# Altium footprint library PcbLib1.PcbLib: 50 footprints (part 1 of 4)
Each footprint in its own frame and in the unit in brackets; x right, y up, seen from the top. Pads: shape width x height; smd on the part's side, far side on the other; paste and mask are expansions set on the pad; w line width, h text height; cw(c..) or ccw(c..) is an arc to the next point about the centre after c.
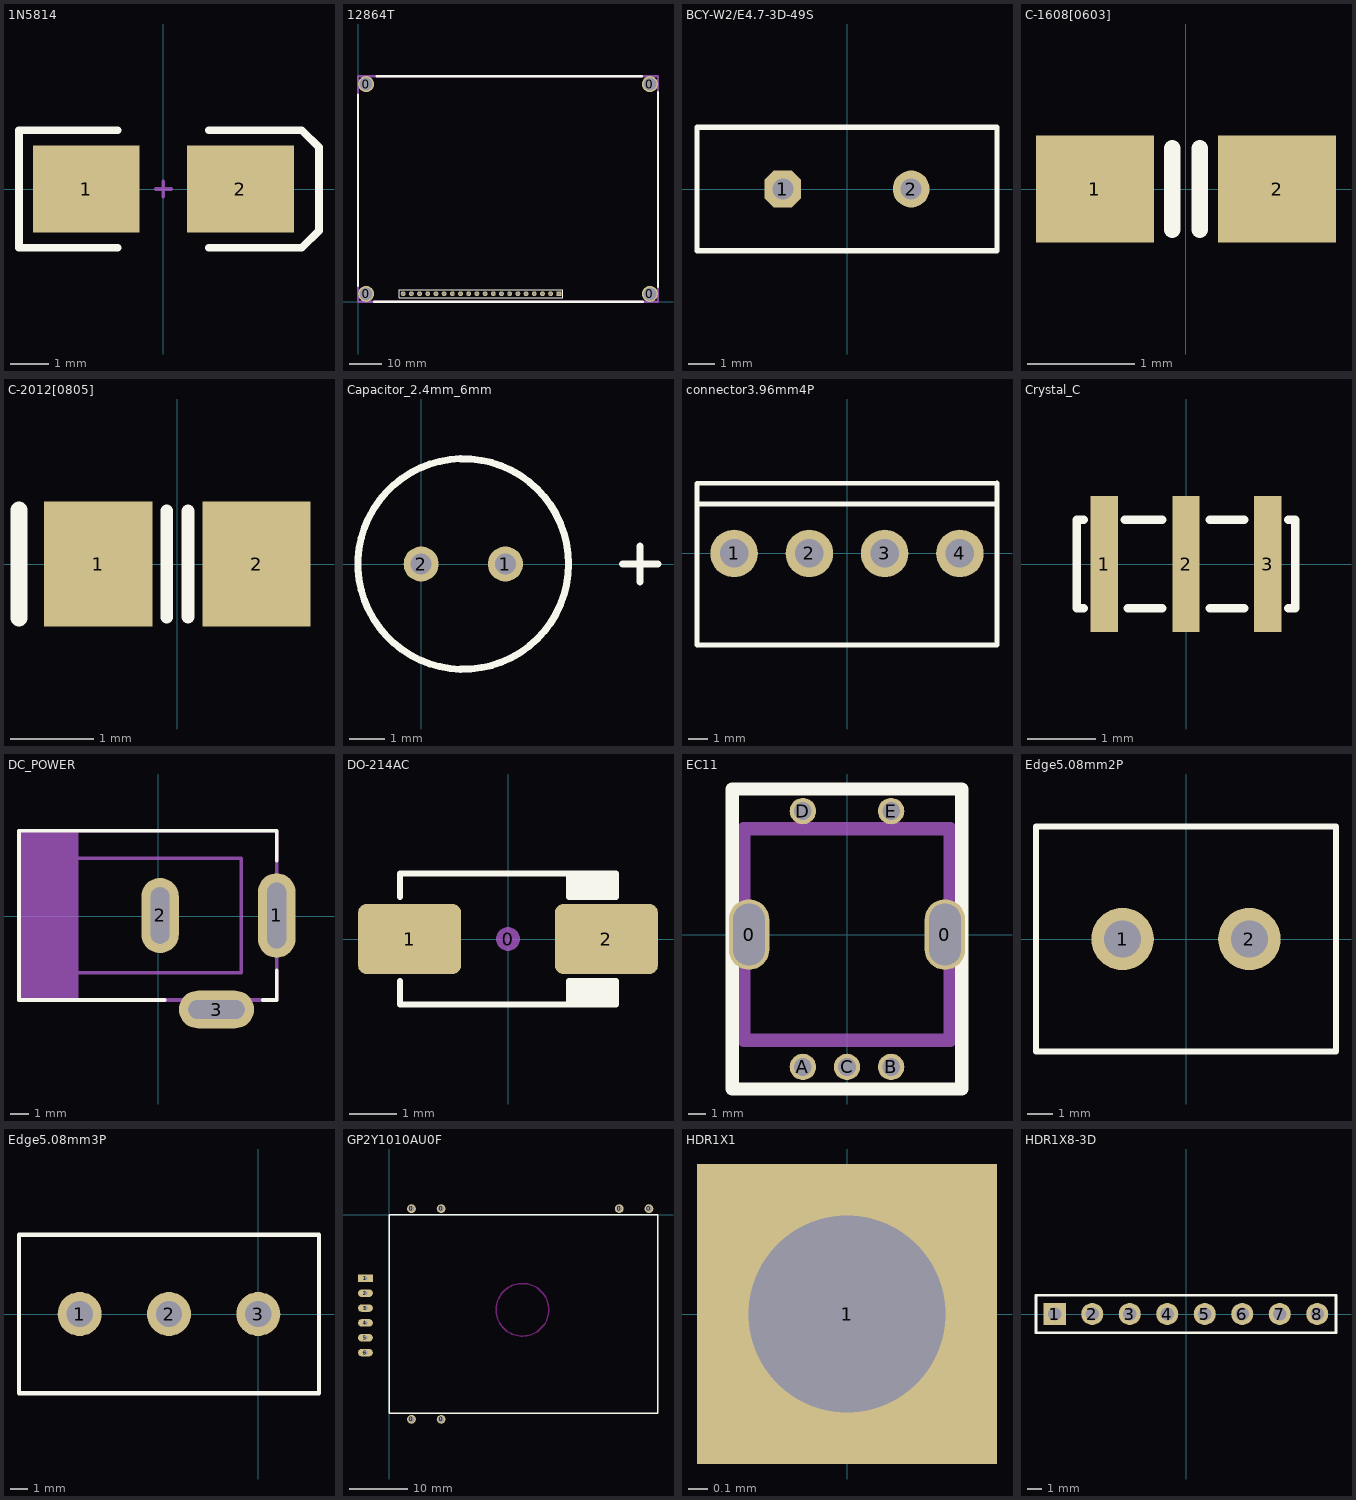
[diagram p0: the footprints below, top view; thin cyan lines are the x and y axes]

## 1N5814 [mm] "DO-214-AA/SMB; 2 C-Bend Leads; Body 5.3 x 3.6 mm, inc. leads (LxW)"
height 2.54
pads (2):
  rect 2.808x2.3 smd: 1(-2.032,0) 2(2.032,0)
Top Overlay:
  lines w0.2: -1.2,-1.55 -3.8,-1.55 -3.8,1.55 -1.2,1.55 ; 1.2,-1.55 3.65,-1.55 4.1,-1.1 4.1,1.1 3.65,1.55 1.2,1.55
Mechanical 1:
  lines w0.1: -0.2,0 0.2,0 ; 0,-0.2 0,0.2

## 12864T [mm]
height 12.5
pads (24):
  round 5 hole 4: 0(2.5,2.5) 0(2.5,67.5) 0(90.5,2.5) 0(90.5,67.5)
  rect 1.5x1.5 hole 0.9: 1(62.26,2.54)
  round 1.5 hole 0.9: 2(59.72,2.54) 3(57.18,2.54) 4(54.64,2.54) 5(52.1,2.54) 6(49.56,2.54) 7(47.02,2.54) 8(44.48,2.54) 9(41.94,2.54) 10(39.4,2.54) 11(36.86,2.54) 12(34.32,2.54) 13(31.78,2.54) 14(29.24,2.54) 15(26.7,2.54) 16(24.16,2.54) 17(21.62,2.54) 18(19.08,2.54) 19(16.54,2.54) 20(14,2.54)
Top Overlay:
  lines w0.2: 12.73,1.27 12.73,3.81 63.53,3.81 63.53,1.27 61.625,1.27 12.73,1.27
  lines w0.762: 0,5 0,64.25 ; 5,0 88.25,0 ; 5.75,70 88,70 ; 93,4.75 93,65
Mechanical 15:
  lines w0.762: 0,0 93,0 93,70 0,70 0,0

## BCY-W2/E4.7-3D-49S [mm] "Quartz Crystal, Thru-Hole; 2 Leads; Body 11.35 x 4.65 x 13.46 mm (LxWxH max)"
height 13.46
pads (2):
  oct 1.4x1.4 hole 0.8: 1(-2.44,0)
  round 1.4 hole 0.8: 2(2.44,0)
Top Overlay:
  lines w0.2: -5.7,-2.35 5.7,-2.35 5.7,2.35 -5.7,2.35 -5.7,-2.35
3D body: height 3.6, standoff -3, extent -5.461,-2.286 5.519,2.205

## C-1608[0603] [mm] "Chip Capacitor; Body 1.6 x 0.8 mm (LxW typ)"
height 1.35
pads (2):
  rect 1.1x1 smd: 1(-0.85,0) 2(0.85,0)
Top Overlay:
  lines w0.152: -0.127,-0.381 -0.127,0.381 ; 0.127,-0.381 0.127,0.381
3D body: height 0.29, standoff -0.01, extent -0.8,-0.419 0.8,0.381

## C-2012[0805] [mm] "Chip Capacitor; Body 2.0 x 1.2 mm (LxW typ)"
height 1.1
pads (2):
  rect 1.3x1.5 smd: 1(-0.95,0) 2(0.95,0)
Top Overlay:
  lines w0.152: -0.127,-0.635 -0.127,0.635 ; 0.127,-0.635 0.127,0.635
  lines w0.2: -1.9,-0.65 -1.9,0.65
3D body: height 0.78, standoff 0, extent -1,-0.635 1,0.615

## Capacitor_2.4mm_6mm [mm]
pads (2):
  round 1 hole 0.6: 1(2.4,0) 2(0,0)
Top Overlay:
  circle w0.2: c1.2,0 r3
  lines w0.2: 5.732,0 6.748,0 ; 6.24,-0.508 6.24,0.508

## connector3.96mm4P [mm] "白色连接器,wire to board 3.96mm间距4P"
height 14.6
pads (4):
  round 2.5 hole 1.5: 1(-5.94,0) 2(-1.98,0) 3(1.98,0) 4(5.94,0)
Top Overlay:
  lines w0.254: -7.851,2.609 7.737,2.609 ; 7.859,3.691 -7.89,3.691 -7.89,-4.811 7.89,-4.811 7.89,3.7

## Crystal_C [mm] "含电容晶振，村田 3."
height 0.7
pads (3):
  rect 0.4x2 smd: 1(-1.2,0) 2(0,0) 3(1.2,0)
Top Overlay:
  lines w0.127: -1.5,-0.65 -1.6,-0.65 -1.6,0.65 -1.5,0.65 ; -0.9,0.65 -0.35,0.65 ; -0.85,-0.65 -0.35,-0.65 ; 0.35,-0.65 0.85,-0.65 ; 0.35,0.65 0.85,0.65 ; 1.5,-0.65 1.6,-0.65 1.6,0.65 1.5,0.65
3D body: height 0.7, standoff 0, extent -1.6,-0.635 1.6,0.665

## DC_POWER [mm]
pads (3):
  oval 2x4.5 hole 1 slot 3.5 at 90 deg: 1(6.3,0.036)
  oval 2x4 hole 1 slot 3 at 90 deg: 2(0.1,0.036)
  oval 4x2 hole 1 slot 3 at 0 deg: 3(3.1,-4.964)
Top Overlay:
  lines w0.2: 0.347,-4.464 -7.4,-4.464 -7.4,4.536 6.3,4.536 6.3,2.953 ; 5.554,-4.464 6.3,-4.464 6.3,-2.88
Mechanical 7:
  rectangle: -7.402,-4.464 -4.227,4.536
  lines w0.2: -7.4,-3.012 4.411,-3.012 4.411,3.084 -7.4,3.084 ; 0.1,-0.964 0.1,1.036 ; 2.1,-4.964 4.1,-4.964 ; 6.3,-1.164 6.3,1.236 ; -7.4,-4.464 -7.4,4.536 6.3,4.536 6.3,-4.464 5.3,-4.464 -7.4,-4.464
3D body: height 11, standoff -3.5, extent -7.665,-5.171 6.835,4.329

## DO-214AC [mm] "JEDEC DO214 variation AC. SMA"
height 2.5
pads (3):
  round 0.508 on Mech15: 0(0,0)
  rrect25% 2.2x1.5 smd: 1(-2.1,0) 2(2.1,0)
Top Overlay:
  rectangle: 1.3,-1.4 2.3,-0.9
  rectangle: 1.3,0.9 2.3,1.4
  lines w0.127: -2.3,-0.9 -2.3,-1.4 2.3,-1.4 2.3,-0.9 1.3,-0.9 1.3,-1.4 ; -2.3,0.9 -2.3,1.4 2.3,1.4 2.3,0.9 1.3,0.9 ; 1.3,0.911 1.3,1.4
3D body: height 2.42, standoff 0.02, extent -2.6,-1.3 2.6,1.3

## EC11 [mm]
height 26.5
pads (7):
  oval 2.3x4 hole 1.8 slot 3.5 at 90 deg: 0(-5.55,0) 0(5.55,0)
  round 1.5 hole 1: A(-2.5,-7.5) B(2.5,-7.5) C(0,-7.5) D(-2.5,7) E(2.5,7)
Top Overlay:
  lines w0.762: -6.5,-8.75 6.5,-8.75 6.5,8.25 -6.5,8.25 -6.5,-8.75
Mechanical 15:
  lines w0.762: -5.85,-6 5.85,-6 5.85,6 -5.85,6 -5.85,-6
3D body: height 24.82, standoff -3.38, extent -6.589,-7.654 6.51,7.296

## Edge5.08mm2P [mm] "绿色接线端子5.0"
height 8
pads (2):
  round 2.5 hole 1.5: 1(-2.54,0) 2(2.54,0)
Top Overlay:
  lines w0.254: -6,-4.5 6,-4.5 6,4.5 -6,4.5 -6,-4.5

## Edge5.08mm3P [mm] "绿色接线端子5.0"
height 8
pads (3):
  round 2.5 hole 1.5: 1(-10.16,0) 2(-5.08,0) 3(0,0)
Top Overlay:
  lines w0.254: -13.614,-4.5 3.454,-4.5 3.454,4.5 -13.614,4.5 -13.614,-4.5

## GP2Y1010AU0F [mm]
pads (12):
  round 1.5 hole 1: 0(3.81,-35.052) 0(3.81,1.016) 0(8.89,-35.052) 0(8.89,1.016) 0(39.37,1.016) 0(44.45,1.016)
  rect 2.54x1.27 hole 0.635: 1(-4.064,-10.922)
  oval 2.54x1.27 hole 0.635: 2(-4.064,-13.462) 3(-4.064,-16.002) 4(-4.064,-18.542) 5(-4.064,-21.082) 6(-4.064,-23.622)
Top Overlay:
  lines w0.254: 45.964,-34 0,-34 0,0 46,0 46,-34
Keep-Out Layer:
  circle w0.254: c22.8,-16.3 r4.5

## HDR1X1 [mil]
pads (1):
  rect 60x60 hole 39.37: 1(0,0)

## HDR1X8-3D [mm] "Connector; Header; 8 Position"
pads (8):
  rect 1.5x1.5 hole 0.9: 1(-8.89,0)
  round 1.5 hole 0.9: 2(-6.35,0) 3(-3.81,0) 4(-1.27,0) 5(1.27,0) 6(3.81,0) 7(6.35,0) 8(8.89,0)
Top Overlay:
  lines w0.2: -10.16,-1.27 10.16,-1.27 10.16,1.27 -10.16,1.27 -10.16,-1.27
3D body: height 8.6, standoff -2.94, extent -10.135,-1.27 10.185,1.27